# Altium footprint library DrPCB.PcbLib: 910 footprints (part 42 of 57)
Each footprint in its own frame and in the unit in brackets; x right, y up, seen from the top. Pads: shape width x height; smd on the part's side, far side on the other; paste and mask are expansions set on the pad; w line width, h text height; cw(c..) or ccw(c..) is an arc to the next point about the centre after c.
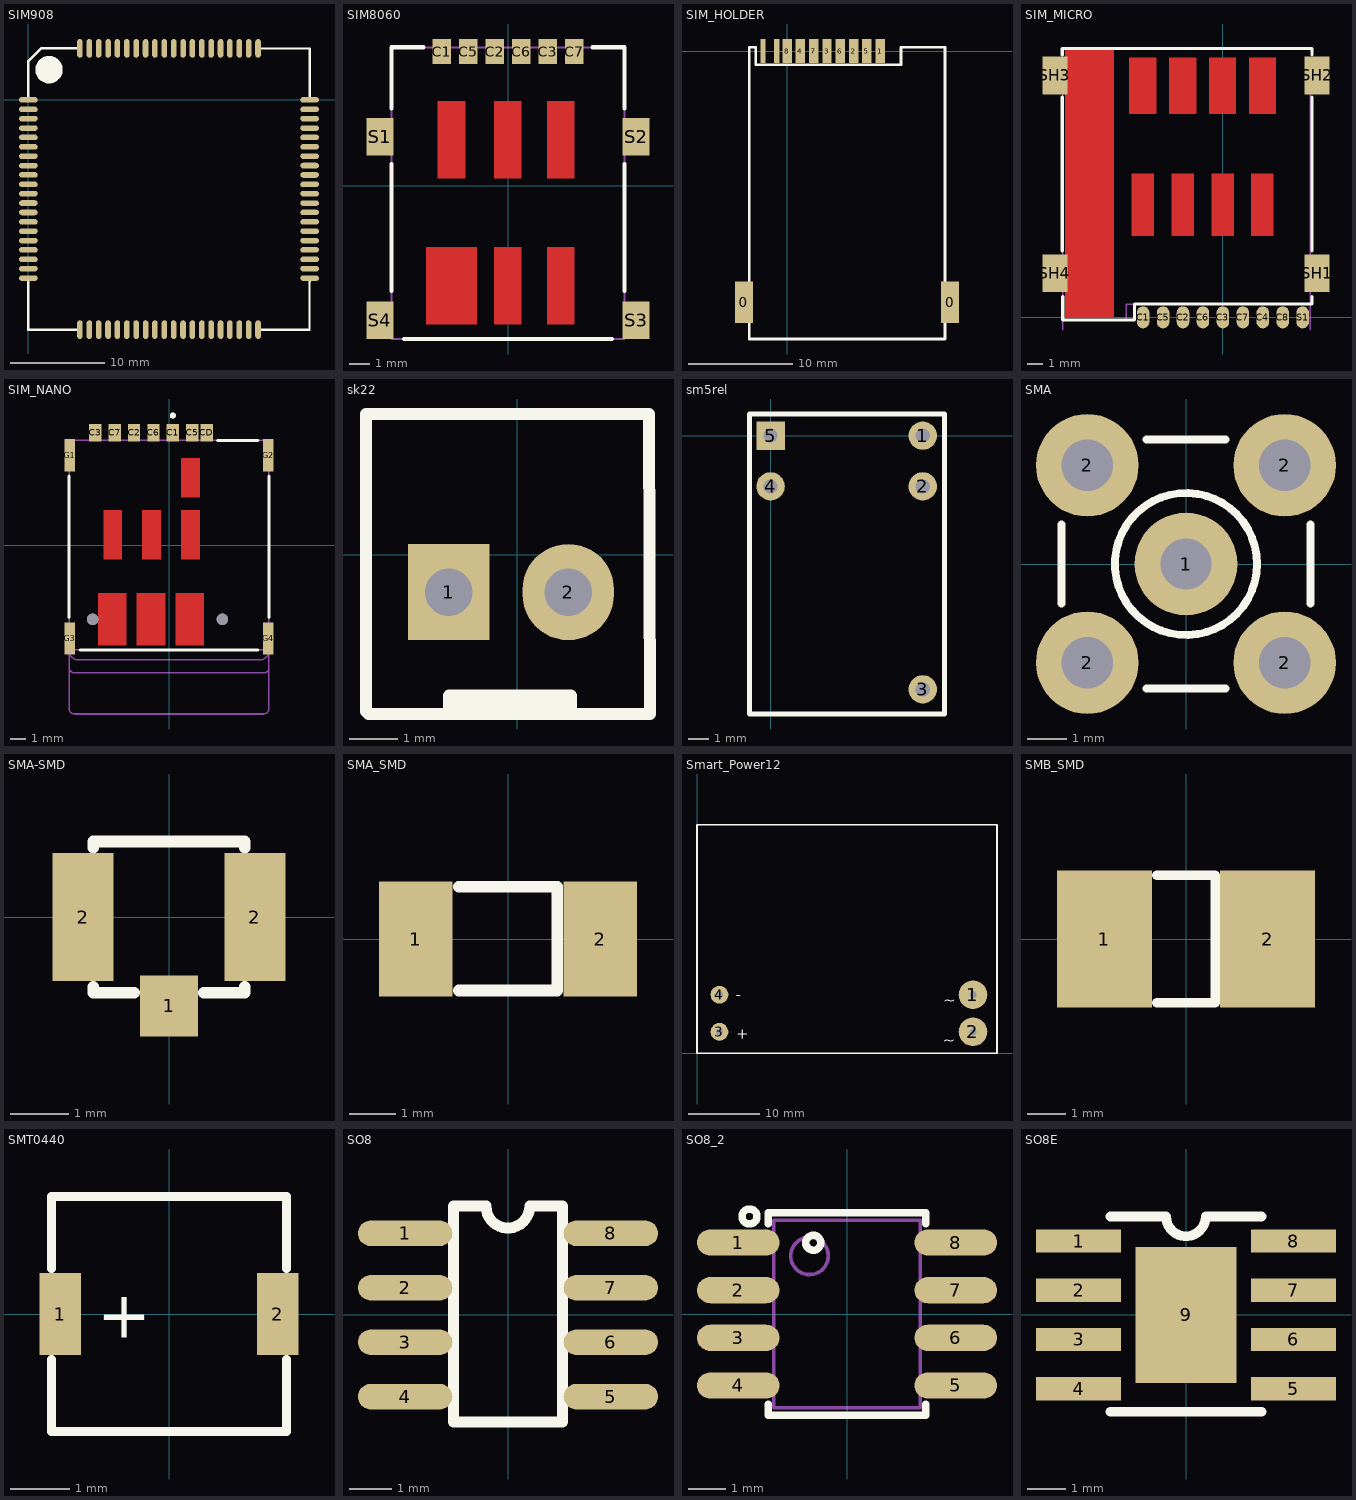
[diagram p41: the footprints below, top view; thin cyan lines are the x and y axes]

## SIM908 [mm]
pads (80):
  oval 2x0.6 smd: 1(0,0) 2(0,-1) 3(0,-2) 4(0,-3) 5(0,-4) 6(0,-5) 7(0,-6) 8(0,-7) 9(0,-8) 10(0,-9) 11(0,-10) 12(0,-11) 13(0,-12) 14(0,-13) 15(0,-14) 16(0,-15) 17(0,-16) 18(0,-17) 19(0,-18) 20(0,-19) 41(30,-19) 42(30,-18) 43(30,-17) 44(30,-16) 45(30,-15) 46(30,-14) 47(30,-13) 48(30,-12) 49(30,-11) 50(30,-10) 51(30,-9) 52(30,-8) 53(30,-7) 54(30,-6) 55(30,-5) 56(30,-4) 57(30,-3) 58(30,-2) 59(30,-1) 60(30,0)
  oval 0.6x2 smd: 21(5.5,-24.5) 22(6.5,-24.5) 23(7.5,-24.5) 24(8.5,-24.5) 25(9.5,-24.5) 26(10.5,-24.5) 27(11.5,-24.5) 28(12.5,-24.5) 29(13.5,-24.5) 30(14.5,-24.5) 31(15.5,-24.5) 32(16.5,-24.5) 33(17.5,-24.5) 34(18.5,-24.5) 35(19.5,-24.5) 36(20.5,-24.5) 37(21.5,-24.5) 38(22.5,-24.5) 39(23.5,-24.5) 40(24.5,-24.5) 61(24.5,5.5) 62(23.5,5.5) 63(22.5,5.5) 64(21.5,5.5) 65(20.5,5.5) 66(19.5,5.5) 67(18.5,5.5) 68(17.5,5.5) 69(16.5,5.5) 70(15.5,5.5) 71(14.5,5.5) 72(13.5,5.5) 73(12.5,5.5) 74(11.5,5.5) 75(10.5,5.5) 76(9.5,5.5) 77(8.5,5.5) 78(7.5,5.5) 79(6.5,5.5) 80(5.5,5.5)
Top Overlay:
  circle w1.5: c2.201,3.226 r0.708
  lines w0.254: -0.013,-24.498 -0.013,-19.317 ; 0,-24.511 5.182,-24.511 ; 0,0.292 0,4.153 ; 0,4.14 1.36,5.5 ; 1.372,5.499 5.182,5.499 ; 24.841,5.486 30.01,5.486 30.01,0.33 ; 24.854,-24.498 29.985,-24.498 29.985,-19.342 29.997,-19.329

## SIM8060 [mm]
pads (10):
  rect 0.9x1.2 smd: C1(-3.175,6.45) C2(-0.635,6.45) C3(1.905,6.45) C5(-1.905,6.45) C6(0.635,6.45) C7(3.175,6.45)
  rect 1.3x1.8 smd: S1(-6.15,2.35) S2(6.15,2.35) S3(6.15,-6.45) S4(-6.15,-6.45)
Top Layer:
  pour cut-out: -3.924,-2.953 -1.501,-2.953 -1.501,-6.653 -3.924,-6.653
  pour cut-out: -0.655,-2.953 0.645,-2.953 0.645,-6.653 -0.655,-6.653
  pour cut-out: 1.885,-2.953 3.185,-2.953 3.185,-6.653 1.885,-6.653
  pour cut-out: 1.885,4.07 3.185,4.07 3.185,0.37 1.885,0.37
  pour cut-out: -0.655,4.07 0.645,4.07 0.645,0.37 -0.655,0.37
  pour cut-out: -3.36,4.07 -2.06,4.07 -2.06,0.37 -3.36,0.37
  pour cut-out: -3.34,4.077
Top Overlay:
  lines w0.2: -5.6,-5.049 -5.6,1.047 ; -5.6,3.714 -5.6,6.65 -4.064,6.65 ; -5,-7.35 5,-7.35 ; 4.064,6.65 5.6,6.65 5.6,3.714 ; 5.6,-5.049 5.6,1.047
Mechanical 13:
  lines w0.1: -5.6,-7.35 5.6,-7.35 5.6,6.65 -5.6,6.65 -5.6,-7.35
3D body "User Library-SIM8060.step": height 1.4, standoff -0.05, extent -6.2,-7.368 6.2,6.632

## SIM_HOLDER [mm]
pads (12):
  rect 1.7x4 smd: 0(-4.13,-24) 0(15.57,-24)
  rect 0.9x2.3 smd: 1(8.89,0) 2(6.35,0) 3(3.81,0) 4(1.27,0) 5(7.62,0) 6(5.08,0) 7(2.54,0) 8(0,0)
  rect 0.5x2.3 smd: 9(-1,0) 10(-2.3,0)
Top Overlay:
  lines w0.254: -3.62,-27.5 -3.62,0.35 -3,0.35 ; -3.607,-27.508 15.062,-27.508 ; -3.607,-27.483 -3.581,-27.508 ; -2.997,0.343 -2.997,-1.283 -2.984,-1.295 10.871,-1.295 10.871,0.343 ; 10.88,0.35 15.08,0.35 15.08,-27.5

## SIM_MICRO [mm] "Micro SIM Card Connector, SIM7100, Push-Push Type, 8 Pin, SMT, 1.50mm Profile"
height 1.5
pads (13):
  oval 0.8x1.4 smd: C1(-5.08,0) C2(-2.54,0) C3(0,0) C4(2.54,0) C5(-3.81,0) C6(-1.27,0) C7(1.27,0) C8(3.81,0) S1(5.08,0)
  rect 1.6x2.4 smd: SH1(6,2.8) SH2(6,15.4) SH3(-10.7,15.4) SH4(-10.7,2.8)
Top Layer:
  pour cut-out: -6.94,17.005 -10.03,17.005 -10.03,0.005 -6.94,0.005
  pour cut-out: -5.95,16.525 -5.95,12.945 -4.25,12.945 -4.25,16.525
  pour cut-out: -3.41,16.525 -3.41,12.945 -1.71,12.945 -1.71,16.525
  pour cut-out: -0.87,16.525 -0.87,12.945 0.83,12.945 0.83,16.525
  pour cut-out: 1.67,16.525 1.67,12.945 3.37,12.945 3.37,16.525
  pour cut-out: -5.8,9.145 -4.4,9.145 -4.4,5.205 -5.8,5.205
  pour cut-out: -3.26,9.145 -1.86,9.145 -1.86,5.205 -3.26,5.205
  pour cut-out: -0.72,9.145 0.68,9.145 0.68,5.205 -0.72,5.205
  pour cut-out: 1.82,9.145 3.22,9.145 3.22,5.205 1.82,5.205
Top Overlay:
  lines w0.2: -10.225,4.215 -10.225,14.015 ; -10.225,16.715 -10.225,17.115 5.675,17.115 5.675,16.715 ; -10.2,1.315 -10.2,-0.165 -5.625,-0.165 -5.625,0.845 5.675,0.845 5.675,1.315 ; 5.675,4.215 5.675,14.015
Mechanical 13:
  lines w0.1: -10.2,-0.775 -10.2,15.385 ; -10.2,-0.165 -6.165,-0.165 -6.165,0.845 5.55,0.845 ; 5.55,-0.775 5.55,16.395
3D body "sim7100-8-1-15-00-a_reva.step": height 1.47, standoff -0.03, extent -10.7,-0.325 6.05,17.005

## SIM_NANO [mm]
pads (13):
  rect 0.8x1.14 smd: C1(0.25,7.37) C2(-2.29,7.37) C3(-4.83,7.37) C5(1.52,7.37) C6(-1.02,7.37) C7(-3.56,7.37) CD(2.47,7.37)
  rect 0.7x2.1 smd: G1(-6.5,5.89) G2(6.5,5.89) G3(-6.5,-6.11) G4(6.5,-6.11)
  round 0.75 hole 0.75 unplated: ""(-5,-4.86) ""(3.5,-4.86)
Top Layer:
  pour cut-out: 0.8,5.685 2,5.685 2,3.135 0.8,3.135
  pour cut-out: 0.8,2.295 2,2.295 2,-0.915 0.8,-0.915
  pour cut-out: -1.74,2.295 -0.54,2.295 -0.54,-0.915 -1.74,-0.915
  pour cut-out: -4.28,2.295 -3.08,2.295 -3.08,-0.915 -4.28,-0.915
  pour cut-out: -4.645,-3.16 -2.795,-3.16 -2.795,-6.56 -4.645,-6.56
  pour cut-out: -2.105,-3.16 -0.255,-3.16 -0.255,-6.56 -2.105,-6.56
  pour cut-out: -2.105,-3.16
  pour cut-out: 0.435,-3.16 2.285,-3.16 2.285,-6.56 0.435,-6.56
Top Overlay:
  circle w0.2: c0.25,8.49 r0.1
  lines w0.2: -6.545,-4.74 -6.545,4.52 ; -5.83,-6.86 5.83,-6.86 ; 3.19,6.86 5.83,6.86 ; 6.545,-4.74 6.545,4.52
Mechanical 13:
  circle w0.2: c0.25,8.49 r0.1
  lines w0.1: -6.545,-10.713 ccw(c-6.198,-10.713) -6.198,-11.06 ; -6.545,-10.71 -6.545,-8.01 -6.545,-6.86 ; -6.545,-8.013 ccw(c-6.198,-8.013) -6.198,-8.36 ; -6.2,-11.06 6.2,-11.06 ; -6.2,-8.36 6.2,-8.36 ccw(c6.222,-8.037) 6.545,-8.06 ; 6.198,-11.06 ccw(c6.198,-10.713) 6.545,-10.713 ; 6.545,-10.71 6.545,-8.06 ; -6.545,-6.86 ccw(c-5.947,-6.913) -6,-7.51 6,-7.51 ccw(c5.947,-6.913) 6.545,-6.86 ; -6.545,-6.86 6.545,-6.86 ; -6.545,-6.86 -6.545,6.86 6.545,6.86 6.545,-6.86 ; 6.545,-8.06 6.545,-6.86
3D body "SIM8066-6-1-14-01-A--3DModel-STEP-56544.STEP": height 1.44, standoff -0.37, extent -6.545,-6.94 6.545,7.64

## sk22 [mm]
pads (2):
  rect 1.702x2.007 hole 0.991: 1(-1.429,-0.78)
  oval 1.905x2.007 hole 0.991: 2(1.06,-0.78)
Top Overlay:
  lines w0.254: -3.156,-3.269 -3.156,2.929 2.711,2.929 ; -3.106,-3.32 2.762,-3.32 2.736,2.929 ; -1.429,-3.32 -1.429,-2.939 1.111,-2.939 1.111,-3.32 1.111,-3.066 -1.429,-3.066

## sm5rel [mm]
pads (5):
  round 1.4 hole 0.7: 1(7.5,0) 2(7.5,-2.5) 3(7.5,-12.5) 4(0,-2.5)
  rect 1.4x1.4 hole 0.7: 5(0,0)
Top Overlay:
  lines w0.254: 8.532,-13.713 -1.034,-13.713 -1.034,1.066 8.565,1.066 8.565,-13.713

## SMA [mm]
pads (5):
  round 2.6 hole 1.3: 1(0,0) 2(-2.5,-2.5) 2(-2.5,2.5) 2(2.5,-2.5) 2(2.5,2.5)
Top Overlay:
  circle w0.2: c0,0 r1.8
  lines w0.2: -3.15,-1 -3.15,1 ; -1,-3.15 1,-3.15 ; -1,3.15 1,3.15 ; 3.15,-1 3.15,1

## SMA-SMD [mm]
pads (3):
  rect 1x1.05 smd: 1(0,-1.525)
  rect 1.05x2.2 smd: 2(-1.475,0) 2(1.475,0)
Top Overlay:
  lines w0.2: -1.3,-1.194 -1.3,-1.3 -0.597,-1.3 ; -1.3,1.194 -1.3,1.3 1.3,1.3 1.3,1.194 ; 0.597,-1.3 1.3,-1.3 1.3,-1.194

## SMA_SMD [mm]
pads (2):
  rect 1.6x2.5 smd: 1(-2,0) 2(2,0)
Top Overlay:
  lines w0.254: -1.067,-1.118 1.067,-1.118 1.067,1.13 -1.067,1.13
3D body "User Library-Diode Molded Body.STEP": height 2.32, standoff 0.01, extent -2.5,-1.378 2.5,1.322

## Smart_Power12 [mm]
pads (4):
  round 4 hole 1: 1(38.641,8.2) 2(38.641,3)
  round 2.5 hole 1: 3(3.141,3) 4(3.141,8.2)
Top Overlay:
  lines w0.254: 0,32 0,0 42,0 ; 0.001,32.003 42.001,32.003 ; 41.998,0.002 41.998,32.002
  text "+" at 5.476,2.017 h1.52
  text "-" at 5.423,7.467 h1.52
  text "~" at 34.397,1.136 h1.52
  text "~" at 34.464,6.736 h1.52

## SMB_SMD [mm]
pads (2):
  rect 2.5x3.6 smd: 1(-2.146,0) 2(2.146,0)
Top Overlay:
  lines w0.254: -0.768,-1.675 0.768,-1.675 0.768,1.678 -0.768,1.678
3D body "Diode.STEP": height 2.45, standoff 0.03, extent -2.75,-1.95 2.75,1.95

## SMT0440 [mm]
pads (2):
  rect 0.7x1.4 smd: 1(-1.85,0) 2(1.85,0)
Top Overlay:
  lines w0.15: -2,-0.775 -2,-2 2,-2 2,-0.775 ; -2,0.775 -2,2 2,2 2,0.775
  text "+" at -1.219,-0.4 h0.8
3D body: height 1.25, standoff -1.25, extent -0.267,0.47 -0.267,0.47
3D body: height 2, standoff 0, extent -1.994,-1.994 1.994,1.994

## SO8 [mm]
pads (8):
  oval 2.2x0.6 smd: 1(-2.4,1.905) 2(-2.4,0.635) 3(-2.4,-0.635) 4(-2.4,-1.905) 5(2.4,-1.905) 6(2.4,-0.635) 7(2.4,0.635) 8(2.4,1.905)
Top Overlay:
  lines w0.254: -0.513,2.54 ccw(c-0.002,2.54) 0.508,2.54 1.27,2.54 1.27,-2.5 -1.27,-2.5 -1.27,2.54 -0.508,2.54
3D body "User Library-SOIC-8-1.step": height 1.75, standoff 0, extent -3,-2.45 3,2.45

## SO8_2 [mm] "SOP-8, 5x3.9mm body 1.27mm pitch, SOT96-1, M08A, S8, SOIC8, VO8, MS-012AA(JEDEC), R-8, 8S2, VOG8"
height 1.8
pads (8):
  oval 2.2x0.7 smd: 1(-2.9,1.905) 2(-2.9,0.635) 3(-2.9,-0.635) 4(-2.9,-1.905) 5(2.9,-1.905) 6(2.9,-0.635) 7(2.9,0.635) 8(2.9,1.905)
Top Overlay:
  circle w0.2: c-0.9,1.9 r0.2
  circle w0.2: c-2.6,2.6 r0.2
  lines w0.2: -2.1,-2.4 -2.1,-2.7 2.1,-2.7 2.1,-2.4 ; -2.1,2.4 -2.1,2.7 2.1,2.7 2.1,2.4
Mechanical 13:
  circle w0.1: c-1,1.55 r0.5
  lines w0.1: -1.95,-2.5 -1.95,2.5 1.95,2.5 1.95,-2.5 -1.95,-2.5
3D body "User Library-so8-3.step": height 1.7, standoff 0, extent -3,-2.45 3,2.45

## SO8E [mm]
pads (9):
  rect 2.2x0.6 smd paste-0.12: 1(-2.773,1.905) 2(-2.773,0.635) 3(-2.773,-0.635) 4(-2.773,-1.905) 5(2.773,-1.905) 6(2.773,-0.635) 7(2.773,0.635) 8(2.773,1.905)
  rect 2.6x3.51 smd paste-0.4: 9(0,0)
Top Overlay:
  lines w0.254: -1.95,-2.5 1.95,-2.5 ; -1.95,2.54 -0.513,2.54 ccw(c-0.002,2.54) 0.508,2.54 1.95,2.54
3D body "User Library-SOIC-8-1.step": height 1.75, standoff 0, extent -3,-2.45 3,2.45